# Altium footprint library USB-V11.PcbLib: 36 footprints (part 1 of 3)
Each footprint in its own frame and in the unit in brackets; x right, y up, seen from the top. Pads: shape width x height; smd on the part's side, far side on the other; paste and mask are expansions set on the pad; w line width, h text height; cw(c..) or ccw(c..) is an arc to the next point about the centre after c.
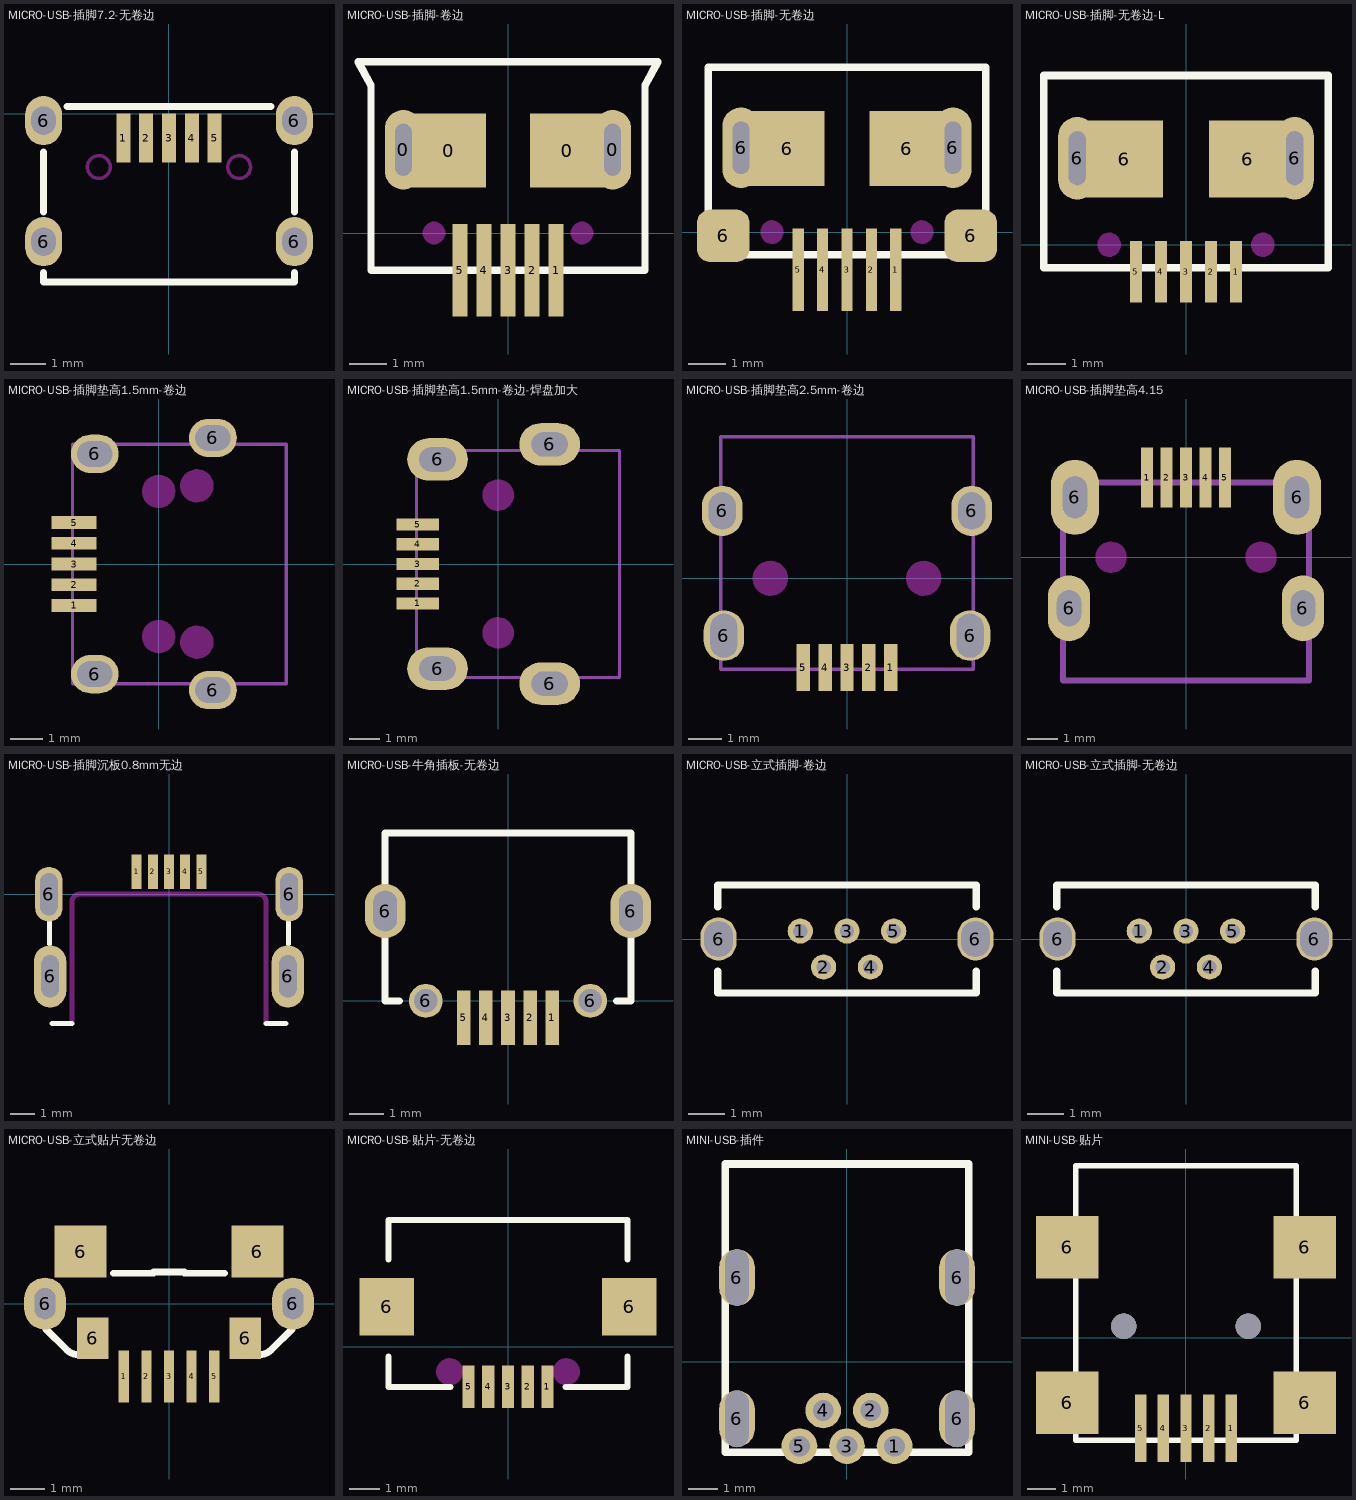
[diagram p0: the footprints below, top view; thin cyan lines are the x and y axes]

## MICRO-USB-插脚7.2-无卷边 [mm]
pads (9):
  rect 0.4x1.4 smd: 1(-1.3,-0.7) 2(-0.65,-0.7) 3(0,-0.7) 4(0.65,-0.7) 5(1.3,-0.7)
  oval 1.05x1.4 hole 0.7 slot 0.8 at 90 deg: 6(-3.575,-3.65) 6(-3.575,-0.2) 6(3.575,-3.65) 6(3.575,-0.2)
Top Overlay:
  lines w0.2: -3.575,-4.525 -3.575,-4.8 3.575,-4.8 3.575,-4.525 ; -3.575,-2.8 -3.575,-1.1 ; -2.9,0.2 2.9,0.2 ; 3.575,-2.8 3.575,-1.1
Keep-Out Layer:
  circle w0.1: c2,-1.525 r0.325
  circle w0.1: c-2,-1.525 r0.325

## MICRO-USB-插脚-卷边 [mm]
pads (9):
  oval 1x2.15 hole 0.45 slot 1.4 at 90 deg: 0(-2.825,2.25)
  rect 2x2 smd: 0(-1.6,2.225) 0(1.6,2.225)
  oval 1x2.15 hole 0.45 slot 1.4 at 90 deg paste+1: 0(2.825,2.25)
  rect 0.4x2.5 smd: 1(1.3,-1) 2(0.65,-1) 3(0,-1) 4(-0.65,-1) 5(-1.3,-1)
Top Overlay:
  lines w0.2: -4.05,4.63 4.05,4.63 3.7,4 3.7,-1 -3.7,-1 -3.7,4 -4.05,4.63
Bottom Solder:
  circle w0.01: c-2,0 r0.3
  circle w0.01: c2,0 r0.3
Keep-Out Layer:
  board cut-out: -2,-0.3 -2.06,-0.3 -2.17,-0.254 -2.254,-0.17 -2.3,-0.06 -2.3,0 -2.3,0.06 -2.254,0.17 -2.17,0.254 -2.06,0.3 -2,0.3 -1.94,0.3 -1.83,0.254 -1.746,0.17 -1.7,0.06 -1.7,0 -1.7,-0.06 -1.746,-0.17 -1.83,-0.254 -1.94,-0.3
  board cut-out: 2,-0.3 1.94,-0.3 1.83,-0.254 1.746,-0.17 1.7,-0.06 1.7,0 1.7,0.06 1.746,0.17 1.83,0.254 1.94,0.3 2,0.3 2.06,0.3 2.17,0.254 2.254,0.17 2.3,0.06 2.3,0 2.3,-0.06 2.254,-0.17 2.17,-0.254 2.06,-0.3
3D body: height 2.35, standoff 0.01, extent -4.05,-1 4.05,4.63

## MICRO-USB-插脚-无卷边 [mm]
pads (11):
  rect 0.3x2.2 smd: 1(1.3,-1) 2(0.65,-1) 3(0,-1) 4(-0.65,-1) 5(-1.3,-1)
  rrect50% 1.4x1.4 smd: 6(-3.3,-0.1) 6(3.3,-0.1)
  oval 1x2.15 hole 0.45 slot 1.4 at 90 deg: 6(-2.825,2.25)
  rect 2x2 smd: 6(-1.6,2.225) 6(1.6,2.225)
  oval 1x2.15 hole 0.45 slot 1.4 at 90 deg paste+1: 6(2.825,2.25)
Top Overlay:
  lines w0.2: -3.7,-0.6 -3.7,4.4 3.7,4.4 3.7,-0.6 -3.7,-0.6
Keep-Out Layer:
  circle w0.01: c2,0 r0.3
  circle w0.01: c-2,0 r0.3
  board cut-out: 2,-0.3 1.94,-0.3 1.83,-0.254 1.746,-0.17 1.7,-0.06 1.7,0 1.7,0.06 1.746,0.17 1.83,0.254 1.94,0.3 2,0.3 2.06,0.3 2.17,0.254 2.254,0.17 2.3,0.06 2.3,0 2.3,-0.06 2.254,-0.17 2.17,-0.254 2.06,-0.3
  board cut-out: -2,-0.3 -2.06,-0.3 -2.17,-0.254 -2.254,-0.17 -2.3,-0.06 -2.3,0 -2.3,0.06 -2.254,0.17 -2.17,0.254 -2.06,0.3 -2,0.3 -1.94,0.3 -1.83,0.254 -1.746,0.17 -1.7,0.06 -1.7,0 -1.7,-0.06 -1.746,-0.17 -1.83,-0.254 -1.94,-0.3
3D body "2174507-2.stp": height 2.73, standoff 0.03, extent -3.9,-0.6 3.9,4.4

## MICRO-USB-插脚-无卷边-L [mm]
pads (9):
  rect 0.3x1.6 smd: 1(1.3,-0.7) 2(0.65,-0.7) 3(0,-0.7) 4(-0.65,-0.7) 5(-1.3,-0.7)
  oval 1x2.15 hole 0.45 slot 1.4 at 90 deg: 6(-2.825,2.25)
  rect 2x2 smd: 6(-1.6,2.225) 6(1.6,2.225)
  oval 1x2.15 hole 0.45 slot 1.4 at 90 deg paste+1: 6(2.825,2.25)
Top Overlay:
  lines w0.2: -3.7,-0.6 -3.7,4.4 3.7,4.4 3.7,-0.6 -3.7,-0.6
Keep-Out Layer:
  circle w0.01: c-2,0 r0.3
  circle w0.01: c2,0 r0.3
  board cut-out: 2,-0.3 1.94,-0.3 1.83,-0.254 1.746,-0.17 1.7,-0.06 1.7,0 1.7,0.06 1.746,0.17 1.83,0.254 1.94,0.3 2,0.3 2.06,0.3 2.17,0.254 2.254,0.17 2.3,0.06 2.3,0 2.3,-0.06 2.254,-0.17 2.17,-0.254 2.06,-0.3
  board cut-out: -2,-0.3 -2.06,-0.3 -2.17,-0.254 -2.254,-0.17 -2.3,-0.06 -2.3,0 -2.3,0.06 -2.254,0.17 -2.17,0.254 -2.06,0.3 -2,0.3 -1.94,0.3 -1.83,0.254 -1.746,0.17 -1.7,0.06 -1.7,0 -1.7,-0.06 -1.746,-0.17 -1.83,-0.254 -1.94,-0.3
3D body "2174507-2.stp": height 2.73, standoff 0.03, extent -3.9,-0.6 3.9,4.4

## MICRO-USB-插脚垫高1.5mm-卷边 [mm]
pads (9):
  rect 1.4x0.4 smd: 1(-2.65,-1.3) 2(-2.65,-0.65) 3(-2.65,0) 4(-2.65,0.65) 5(-2.65,1.3)
  oval 1.5x1.2 / inner oval 1.5x1.2 / far side oval 2x1.4 hole 0.8 slot 1.1 at 0 deg: 6(-2,-3.45) 6(-2,3.45) 6(1.7,-3.95) 6(1.7,3.95)
Keep-Out Layer:
  circle w0.05: c0,2.275 r0.5
  circle w0.05: c0,-2.275 r0.5
  circle w0.05: c1.2,2.45 r0.5
  circle w0.05: c1.2,-2.45 r0.5
  board cut-out: 1.2,-2.95 1.101,-2.95 0.917,-2.874 0.776,-2.733 0.7,-2.549 0.7,-2.45 0.7,-2.351 0.776,-2.167 0.917,-2.026 1.101,-1.95 1.2,-1.95 1.299,-1.95 1.483,-2.026 1.624,-2.167 1.7,-2.351 1.7,-2.45 1.7,-2.549 1.624,-2.733 1.483,-2.874 1.299,-2.95
  board cut-out: 1.2,1.95 1.101,1.95 0.917,2.026 0.776,2.167 0.7,2.351 0.7,2.45 0.7,2.549 0.776,2.733 0.917,2.874 1.101,2.95 1.2,2.95 1.299,2.95 1.483,2.874 1.624,2.733 1.7,2.549 1.7,2.45 1.7,2.351 1.624,2.167 1.483,2.026 1.299,1.95
  board cut-out: 0.5,-2.275 0.5,-2.374 0.424,-2.558 0.283,-2.699 0.099,-2.775 0,-2.775 -0.099,-2.775 -0.283,-2.699 -0.424,-2.558 -0.5,-2.374 -0.5,-2.275 -0.5,-2.176 -0.424,-1.992 -0.283,-1.851 -0.099,-1.775 0,-1.775 0.099,-1.775 0.283,-1.851 0.424,-1.992 0.5,-2.176
  board cut-out: 0.5,2.275 0.5,2.176 0.424,1.992 0.283,1.851 0.099,1.775 0,1.775 -0.099,1.775 -0.283,1.851 -0.424,1.992 -0.5,2.176 -0.5,2.275 -0.5,2.374 -0.424,2.558 -0.283,2.699 -0.099,2.775 0,2.775 0.099,2.775 0.283,2.699 0.424,2.558 0.5,2.374
Mechanical 15:
  lines w0.1: -2.7,-3.75 -2.7,3.75 4,3.75 4,-3.75 -2.7,-3.75
3D body "User Library-Micro USB.STEP": height 4.22, standoff 1.28, extent -1.45,-3.99 3.98,3.99

## MICRO-USB-插脚垫高1.5mm-卷边-焊盘加大 [mm]
pads (9):
  rect 1.4x0.4 smd: 1(-2.65,-1.3) 2(-2.65,-0.65) 3(-2.65,0) 4(-2.65,0.65) 5(-2.65,1.3)
  oval 2x1.4 hole 0.8 slot 1.2 at 0 deg: 6(-2,-3.45) 6(-2,3.45) 6(1.7,-3.95) 6(1.7,3.95)
Top Paste:
  drawing of 32 lines, arcs and shapes, not listed
Keep-Out Layer:
  circle w0.05: c0,-2.275 r0.5
  circle w0.05: c0,2.275 r0.5
  board cut-out: 0.5,2.275 0.5,2.176 0.424,1.992 0.283,1.851 0.099,1.775 0,1.775 -0.099,1.775 -0.283,1.851 -0.424,1.992 -0.5,2.176 -0.5,2.275 -0.5,2.374 -0.424,2.558 -0.283,2.699 -0.099,2.775 0,2.775 0.099,2.775 0.283,2.699 0.424,2.558 0.5,2.374
  board cut-out: 0.5,-2.275 0.5,-2.374 0.424,-2.558 0.283,-2.699 0.099,-2.775 0,-2.775 -0.099,-2.775 -0.283,-2.699 -0.424,-2.558 -0.5,-2.374 -0.5,-2.275 -0.5,-2.176 -0.424,-1.992 -0.283,-1.851 -0.099,-1.775 0,-1.775 0.099,-1.775 0.283,-1.851 0.424,-1.992 0.5,-2.176
Mechanical 15:
  lines w0.1: -2.7,-3.75 4,-3.75 4,3.75 -2.7,3.75 -2.7,-3.75
3D body "User Library-Micro USB.STEP": height 4.22, standoff 1.28, extent -1.45,-3.99 3.98,3.99

## MICRO-USB-插脚垫高2.5mm-卷边 [mm]
pads (9):
  rect 0.4x1.4 smd: 1(1.3,-2.65) 2(0.65,-2.65) 3(0,-2.65) 4(-0.65,-2.65) 5(-1.3,-2.65)
  oval 1.2x1.5 / inner oval 1.2x1.5 / far side oval 1.4x2 hole 0.8 slot 1.1 at 90 deg: 6(-3.7,2) 6(3.7,2)
  oval 1.2x1.5 / inner oval 1.2x1.5 / far side oval 1.4x2 hole 0.8 slot 1.3 at 90 deg: 6(-3.65,-1.7) 6(3.65,-1.7)
Keep-Out Layer:
  circle w0.05: c2.275,0 r0.5
  circle w0.05: c-2.275,0 r0.5
  board cut-out: -2.275,0.5 -2.176,0.5 -1.992,0.424 -1.851,0.283 -1.775,0.099 -1.775,0 -1.775,-0.099 -1.851,-0.283 -1.992,-0.424 -2.176,-0.5 -2.275,-0.5 -2.374,-0.5 -2.558,-0.424 -2.699,-0.283 -2.775,-0.099 -2.775,0 -2.775,0.099 -2.699,0.283 -2.558,0.424 -2.374,0.5
  board cut-out: 2.275,0.5 2.374,0.5 2.558,0.424 2.699,0.283 2.775,0.099 2.775,0 2.775,-0.099 2.699,-0.283 2.558,-0.424 2.374,-0.5 2.275,-0.5 2.176,-0.5 1.992,-0.424 1.851,-0.283 1.775,-0.099 1.775,0 1.775,0.099 1.851,0.283 1.992,0.424 2.176,0.5
Mechanical 15:
  lines w0.1: -3.75,-2.7 -3.75,4.2 3.75,4.2 3.75,-2.7 -3.75,-2.7
3D body "User Library-Micro USB.STEP": height 5.22, standoff 2.28, extent -3.99,-1.25 3.99,4.18

## MICRO-USB-插脚垫高4.15 [mm]
pads (9):
  rect 0.4x2 smd: 1(-1.3,2.65) 2(-0.65,2.65) 3(0,2.65) 4(0.65,2.65) 5(1.3,2.65)
  oval 1.4x2.2 hole 0.8 slot 1.2 at 90 deg: 6(-3.9,-1.7) 6(3.9,-1.7)
  oval 1.6x2.5 hole 0.8 slot 1.4 at 90 deg: 6(-3.7,2) 6(3.7,2)
Top Paste:
  drawing of 16 lines, arcs and shapes, not listed
Keep-Out Layer:
  circle w0.05: c2.5,0 r0.5
  circle w0.05: c-2.5,0 r0.5
  board cut-out: -2.5,-0.5 -2.599,-0.5 -2.783,-0.424 -2.924,-0.283 -3,-0.099 -3,0 -3,0.099 -2.924,0.283 -2.783,0.424 -2.599,0.5 -2.5,0.5 -2.401,0.5 -2.217,0.424 -2.076,0.283 -2,0.099 -2,0 -2,-0.099 -2.076,-0.283 -2.217,-0.424 -2.401,-0.5
  board cut-out: 2.5,-0.5 2.401,-0.5 2.217,-0.424 2.076,-0.283 2,-0.099 2,0 2,0.099 2.076,0.283 2.217,0.424 2.401,0.5 2.5,0.5 2.599,0.5 2.783,0.424 2.924,0.283 3,0.099 3,0 3,-0.099 2.924,-0.283 2.783,-0.424 2.599,-0.5
Mechanical 15:
  lines w0.2: -4.1,-4.1 4.1,-4.1 4.1,2.5 -4.1,2.5 -4.1,-4.1
3D body "User Library-Micro USB.STEP": height 5.22, standoff 2.28, extent -3.99,-4.08 3.99,1.35

## MICRO-USB-插脚沉板0.8mm无边 [mm]
pads (9):
  rect 0.4x1.4 smd: 1(-1.3,0.9) 2(-0.65,0.9) 3(0,0.9) 4(0.65,0.9) 5(1.3,0.9)
  oval 1.1x2.2 hole 0.7 slot 1.7 at 90 deg: 6(-4.825,0) 6(4.825,0)
  oval 1.3x2.5 hole 0.7 slot 1.7 at 90 deg: 6(-4.775,-3.3) 6(4.775,-3.3)
Top Overlay:
  lines w0.2: -4.8,-2 -4.8,-1.1 ; -4.7,-5.2 -3.9,-5.2 ; 3.9,-5.2 4.7,-5.2 ; 4.8,-2 4.8,-1.1
Keep-Out Layer:
  lines w0.2: -3.9,-5.2 -3.9,-0.3 cw(c-3.6,-0.3) -3.6,0 3.6,0 cw(c3.6,-0.3) 3.9,-0.3 3.9,-5.2
3D body "User Library-Micro USB.STEP": height 1.92, standoff -1.02, extent -3.99,-5.48 3.99,-0.05

## MICRO-USB-牛角插板-无卷边 [mm]
pads (9):
  rect 0.4x1.6 smd: 1(1.3,-0.5) 2(0.65,-0.5) 3(0,-0.5) 4(-0.65,-0.5) 5(-1.3,-0.5)
  oval 1.2x1.6 / inner oval 1.5x2 / far side oval 1.5x2 hole 0.7 slot 1.2 at 90 deg: 6(-3.625,2.65) 6(3.625,2.65)
  round 1 / inner round 1 / far side round 1.2 hole 0.7: 6(-2.425,0) 6(2.425,0)
Top Overlay:
  lines w0.2: -3.2,0 -3.625,0 -3.625,4.95 3.625,4.95 3.625,0 3.2,0
3D body "Micro-USB-DIP.STEP": height 2.68, standoff -0.63, extent -4.1,-0.23 4.1,5.2

## MICRO-USB-立式插脚-卷边 [mm]
pads (7):
  round 0.7 / inner round 0.7 / far side oval 1x0.8 hole 0.4: 1(-1.3,0.22) 2(-0.65,-0.78) 3(0,0.22) 4(0.65,-0.78) 5(1.3,0.22)
  oval 1x1.2 / inner oval 1x1.2 / far side oval 1.3x1.5 hole 0.8 slot 1 at 90 deg: 6(-3.575,0) 6(3.575,0)
Top Overlay:
  lines w0.2: -3.6,-0.9 -3.6,-1.5 3.6,-1.5 3.6,-0.9 ; -3.6,0.9 -3.6,1.5 3.6,1.5 3.6,0.9
3D body "User Library-USB3105-30-A_revE.STEP": height 5.66, standoff -1.45, extent -3.98,-1.46 3.98,1.475

## MICRO-USB-立式插脚-无卷边 [mm]
pads (7):
  round 0.7 / inner round 0.7 / far side oval 1x0.8 hole 0.4: 1(-1.3,0.22) 2(-0.65,-0.78) 3(0,0.22) 4(0.65,-0.78) 5(1.3,0.22)
  oval 1x1.2 / inner oval 1x1.2 / far side oval 1.3x1.5 hole 0.8 slot 1 at 90 deg: 6(-3.575,0) 6(3.575,0)
Top Overlay:
  lines w0.2: -3.6,-0.9 -3.6,-1.5 3.6,-1.5 3.6,-0.9 ; -3.6,0.9 -3.6,1.5 3.6,1.5 3.6,0.9
3D body "User Library-USB3105-30-A_revE.STEP": height 5.66, standoff -1.45, extent -3.98,-1.46 3.98,1.475

## MICRO-USB-立式贴片无卷边 [mm]
pads (11):
  rect 0.3x1.5 smd: 1(-1.3,-2.1) 2(-0.65,-2.1) 3(0,-2.1) 4(0.65,-2.1) 5(1.3,-2.1)
  oval 1.2x1.5 hole 0.6 slot 0.9 at 90 deg: 6(-3.575,0) 6(3.575,0)
  rect 1.5x1.5 smd: 6(-2.55,1.5) 6(2.55,1.5)
  rect 0.9x1.2 smd: 6(-2.2,-1) 6(2.2,-1)
Top Overlay:
  lines w0.2: -3.554,-0.729 -2.954,-1.329 ccw(c-2.6,-0.975) -2.6,-1.475 ; -1.6,0.875 -0.45,0.875 -0.45,0.915 0.45,0.915 0.45,0.875 1.6,0.875 ; 2.6,-1.475 ccw(c2.6,-0.975) 2.954,-1.329 3.554,-0.729
3D body "User Library-USB3105-30-A_revE.STEP": height 5.66, standoff -1.45, extent -3.98,-1.76 3.98,1.175

## MICRO-USB-贴片-无卷边 [mm]
pads (7):
  rect 0.4x1.4 smd: 1(1.3,-1.325) 2(0.65,-1.325) 3(0,-1.325) 4(-0.65,-1.325) 5(-1.3,-1.325)
  rect 1.8x1.9 smd: 6(-4,1.325) 6(4,1.325)
Top Overlay:
  lines w0.2: -3.937,-0.325 -3.937,-1.325 -1.905,-1.325 ; -3.937,2.875 -3.937,4.183 ; -3.9,4.183 3.9,4.183 ; 1.905,-1.325 3.9,-1.325 ; 3.937,-1.325 3.937,-0.325 ; 3.937,2.875 3.937,4.183
Keep-Out Layer:
  circle w0.1: c-1.925,-0.825 r0.4
  circle w0.1: c1.925,-0.825 r0.4
  board cut-out: -1.925,-1.225 -1.845,-1.225 -1.698,-1.164 -1.586,-1.052 -1.525,-0.905 -1.525,-0.825 -1.525,-0.745 -1.586,-0.598 -1.698,-0.486 -1.845,-0.425 -1.925,-0.425 -2.005,-0.425 -2.152,-0.486 -2.264,-0.598 -2.325,-0.745 -2.325,-0.825 -2.325,-0.905 -2.264,-1.052 -2.152,-1.164 -2.005,-1.225
  board cut-out: 1.925,-1.225 1.845,-1.225 1.698,-1.164 1.586,-1.052 1.525,-0.905 1.525,-0.825 1.525,-0.745 1.586,-0.598 1.698,-0.486 1.845,-0.425 1.925,-0.425 2.005,-0.425 2.152,-0.486 2.264,-0.598 2.325,-0.745 2.325,-0.825 2.325,-0.905 2.264,-1.052 2.152,-1.164 2.005,-1.225
3D body "User Library-Micro USB.STEP": height 2.72, standoff -0.22, extent -3.99,-1.35 3.99,4.08

## MINI-USB-插件 [mm]
pads (9):
  round 1.2 hole 0.7: 1(1.6,-2.835) 2(0.8,-1.635) 3(0,-2.835) 4(-0.8,-1.635) 5(-1.6,-2.835)
  oval 1.2x1.9 hole 0.8 slot 1.9 at 90 deg: 6(-3.7,-1.915) 6(-3.7,2.835) 6(3.7,-1.915) 6(3.7,2.835)
Top Overlay:
  lines w0.254: -4.1,-3.045 4.1,-3.045 4.1,6.655 -4.1,6.655 -4.1,-3.045

## MINI-USB-贴片 [mm]
pads (9):
  rect 0.4x2.4 smd: 1(1.6,-3.2) 2(0.8,-3.2) 3(0,-3.2) 4(-0.8,-3.2) 5(-1.6,-3.2)
  rect 2.2x2.2 smd: 6(-4.2,-2.3) 6(-4.2,3.2) 6(4.2,-2.3) 6(4.2,3.2)
via 2.2,0.4 diameter 0.9 hole 0.9
via -2.2,0.4 diameter 0.9 hole 0.9
Top Overlay:
  lines w0.2: -3.9,-3.624 3.9,-3.624 3.9,6.076 -3.9,6.076 -3.9,-3.624
3D body "User Library-USB_mini_B.STEP": height 3.95, standoff -1, extent -5.325,-3.382 5.375,5.818